# Altium footprint library UP-ROBOT Connectors(2013-02-26).PcbLib: 121 footprints (part 1 of 8)
Each footprint in its own frame and in the unit in brackets; x right, y up, seen from the top. Pads: shape width x height; smd on the part's side, far side on the other; paste and mask are expansions set on the pad; w line width, h text height; cw(c..) or ccw(c..) is an arc to the next point about the centre after c.
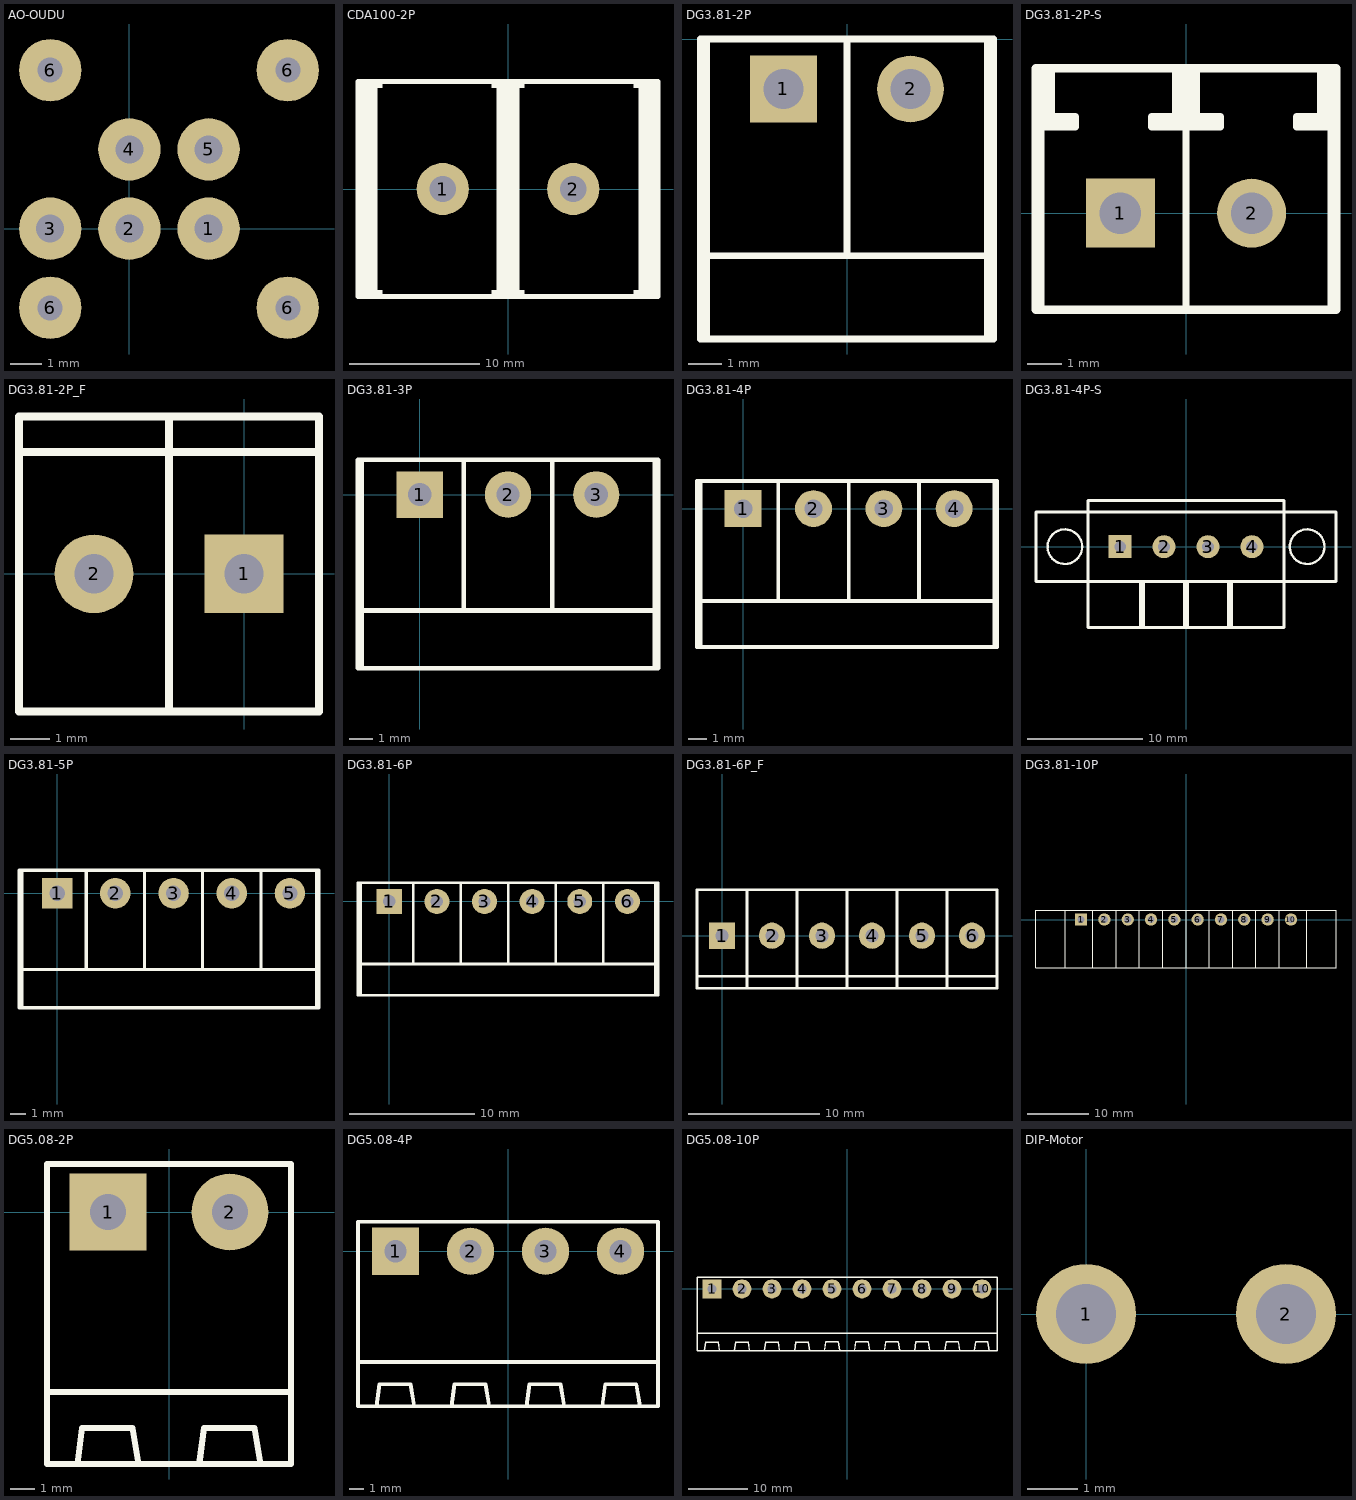
[diagram p0: the footprints below, top view; thin cyan lines are the x and y axes]

## AO-OUDU [mm]
pads (9):
  round 2 hole 0.9: 1(2.54,0) 2(0,0) 3(-2.54,0) 4(0,2.54) 5(2.54,2.54)
  round 2 hole 0.8: 6(-2.54,-2.54) 6(-2.54,5.08) 6(5.08,-2.54) 6(5.08,5.08)
3D body: height 12.96, standoff -2.94, extent -5.512,-4.63 71.198,7.17

## CDA100-2P [mm]
height 18
pads (2):
  round 4 hole 2: 1(-5,0) 2(5,0)
Top Overlay:
  rectangle: -1.25,7.75 1.25,8.25
  region: 1.25,-7.75 -1.25,-7.75 -1.25,-8.25 1.25,-8.25
  rectangle: -0.875,-7.875 0.875,7.9
  rectangle: 10,-7.875 11.45,7.825
  region: 11.5,-7.75 9.625,-7.75 9.625,-8.25 11.5,-8.25
  rectangle: 9.625,7.75 11.5,8.25
  rectangle: -11.45,-7.875 -10,7.95
  region: -9.625,-7.75 -11.5,-7.75 -11.5,-8.25 -9.625,-8.25
  rectangle: -11.5,7.75 -9.625,8.25
  lines w0.2: -11.2,-8.25 -11.2,8.25 ; 0,-8.25 0,8.25 ; 11.2,-8.25 11.2,8.25
  lines w0.4: -11.5,-8.25 11.5,-8.25 11.5,8.25 -11.5,8.25 -11.5,-8.25
3D body: height 17.25, standoff -5.45, extent -10.6,-7.8 11.8,7.6

## DG3.81-2P [mm]
pads (2):
  rect 2x2 hole 1.2: 1(-1.905,-1.5)
  round 2 hole 1.2: 2(1.905,-1.5)
Top Overlay:
  lines w0.203: -4.405,-6.5 4.394,-6.5 ; -4.205,-9 -4.205,0 ; 0,-6.5 0,0 ; 4.205,-9 4.205,0 ; 0,0 4.405,0 4.405,-9 -4.405,-9 -4.405,0 0,0
3D body: height 7, standoff -3.64, extent -4.415,-9.064 4.365,0.076

## DG3.81-2P-S [mm]
pads (2):
  rect 2x2 hole 1.2: 1(-1.905,0)
  round 2 hole 1.2: 2(1.905,0)
Top Overlay:
  lines w0.203: -4.35,-2.8 -4.2,-2.8 -4.2,4.2 ; -4.2,2.5 -3.2,2.5 -3.2,2.8 -3.9,2.8 -3.9,4.2 -4,4.2 -4,2.5 ; -4.2,2.65 -3.35,2.65 ; -0.85,2.65 0,2.65 0.85,2.65 ; -0.2,2.5 -0.2,4.2 -0.3,4.2 -0.3,2.8 -1,2.8 -1,2.5 0,2.5 1,2.5 1,2.8 0.3,2.8 0.3,4.2 0.2,4.2 0.2,2.5 ; 0,-2.8 0,4.2 ; 3.35,2.65 4.2,2.65 ; 4,2.5 4,4.2 3.9,4.2 3.9,2.8 3.2,2.8 3.2,2.5 4.2,2.5 ; 4.1,4.2 4.2,4.2 4.2,-2.8
  lines w0.254: -4.35,-2.8 -4.35,4.2 0,4.2 4.35,4.2 4.35,-2.8 -4.35,-2.8
3D body: height 9.24, standoff -2, extent -4.29,-2.925 4.4,4.375

## DG3.81-2P_F [mm]
pads (2):
  rect 2x2 hole 1: 1(0,0)
  round 2 hole 1: 2(-3.81,0)
Top Overlay:
  lines w0.203: -5.715,3.1 1.905,3.1 ; -5.715,3.937 -5.715,-3.5 1.905,-3.5 1.905,4 -5.715,4 ; -1.905,-3.5 -1.905,3.937
3D body: height 9, standoff -3, extent -5.71,-3.3 1.91,3.7

## DG3.81-3P [mm]
pads (3):
  rect 2x2 hole 1: 1(0,0)
  round 2 hole 1: 2(3.81,0) 3(7.62,0)
Top Overlay:
  lines w0.203: -2.5,-7.5 -2.5,1.5 ; -2.5,-5 10.16,-5 ; 1.905,-5 1.905,1.5 ; 5.715,-5 5.715,1.5 ; 10.16,-7.493 10.16,1.507 ; -2.667,-7.5 -2.667,1.5 1.8,1.5 10.287,1.5 10.287,-7.5 -2.667,-7.5
3D body: height 7, standoff -3.64, extent -2.775,-7.62 10.395,1.52

## DG3.81-4P [mm]
pads (4):
  rect 2x2 hole 1: 1(0,0)
  round 2 hole 1: 2(3.81,0) 3(7.62,0) 4(11.43,0)
Top Overlay:
  lines w0.203: -2.5,-5 13.75,-5 ; -2.3,-7.5 -2.3,1.5 ; 1.905,-5 1.905,1.5 ; 5.715,-5 5.715,1.5 ; 9.525,-5 9.525,1.5 ; 13.6,-7.5 13.6,1.5 ; -2.5,-7.5 -2.5,1.5 1.8,1.5 13.75,1.5 13.75,-7.5 -2.5,-7.5
3D body: height 7, standoff -1.9, extent -2.25,-7.5 13.45,1.5

## DG3.81-4P-S [mm]
pads (4):
  rect 2x2 hole 1: 1(-5.715,0)
  round 2 hole 1: 2(-1.905,0) 3(1.905,0) 4(5.715,0)
Top Overlay:
  circle w0.203: c-10.5,0 r1.5
  circle w0.203: c10.5,0 r1.5
  rectangle: 3.56,-7 4.06,-3
  rectangle: -4.06,-7 -3.56,-3
  rectangle: -0.25,-7 0.25,-3
  lines w0.254: -8.5,3 -8.5,-7 8.5,-7 8.5,3 ; -8.5,3 8.5,3 ; -8.5,3 -13,3 -13,-3 0,-3 13,-3 13,3 8.5,3 ; -8.5,3 -8.5,4 8.5,4 8.5,3

## DG3.81-5P [mm]
pads (5):
  rect 2x2 hole 1: 1(0,0)
  round 2 hole 1: 2(3.81,0) 3(7.62,0) 4(11.43,0) 5(15.24,0)
Top Overlay:
  lines w0.203: -2.5,-5 17.145,-5 ; -2.3,-7.5 -2.3,1.5 ; 1.905,-5 1.905,1.5 ; 5.715,-5 5.715,1.5 ; 9.525,-5 9.525,1.5 ; 13.335,-5 13.335,1.5 ; 17,-7.5 17,1.5 ; -2.5,-7.5 -2.5,1.5 1.8,1.5 17.145,1.5 17.145,-7.5 -2.5,-7.5
3D body: height 7, standoff -1.9, extent -2.255,-7.5 17.255,1.5

## DG3.81-6P [mm]
pads (6):
  rect 2x2 hole 1: 1(0,0)
  round 2 hole 1: 2(3.81,0) 3(7.62,0) 4(11.43,0) 5(15.24,0) 6(19.05,0)
Top Overlay:
  lines w0.203: -2.5,-5 21.4,-5 ; -2.3,-7.5 -2.3,1.5 ; 1.905,-5 1.905,1.5 ; 5.715,-5 5.715,1.5 ; 9.525,-5 9.525,1.5 ; 13.335,-5 13.335,1.5 ; 17.135,-5 17.135,1.4 ; 21.3,-7.5 21.3,1.5 ; -2.5,-7.5 21.5,-7.5 21.5,1.5 1.8,1.5 -2.5,1.5 -2.5,-7.5
3D body: height 7.4, standoff -2.9, extent -2.9,-7.74 21.81,1.5

## DG3.81-6P_F [mm]
pads (6):
  rect 2x2 hole 1: 1(0,0)
  round 2 hole 1: 2(3.81,0) 3(7.62,0) 4(11.43,0) 5(15.24,0) 6(19.05,0)
Top Overlay:
  lines w0.203: -1.905,-3.1 17.145,-3.1 20.945,-3.1 ; 1.905,-3.937 1.905,3.5 ; 5.715,-3.937 5.715,3.5 ; 9.525,-3.937 9.525,3.5 ; 13.335,-3.937 13.335,3.5 ; 17.145,-4 20.955,-4 20.955,3.5 17.145,3.5 ; 17.145,-4 17.145,3.5 ; 17.145,-4 -1.905,-4 -1.905,3.5 17.145,3.5
3D body: height 9, standoff -3, extent 13.335,-3.718 20.955,3.282
3D body: height 9, standoff -3, extent 5.715,-3.718 13.335,3.281
3D body: height 9, standoff -3, extent 9.525,-3.718 17.145,3.281
3D body: height 9, standoff -3, extent -1.905,-3.718 5.715,3.281

## DG3.81-10P [mm]
pads (10):
  rect 2x2 hole 1.2: 1(-17.145,0)
  round 2 hole 1.2: 2(-13.335,0) 3(-9.525,0) 4(-5.715,0) 5(-1.905,0) 6(1.905,0) 7(5.715,0) 8(9.525,0) 9(13.335,0) 10(17.145,0)
Top Overlay:
  lines w0.127: -11.43,-7.85 -11.43,1.5 ; -7.62,-7.85 -7.62,1.5 ; -3.81,-7.85 -3.81,1.5 ; 0,-7.84 0,1.5 ; 3.81,-7.85 3.81,1.5 ; 7.62,-7.85 7.62,1.5 ; 11.43,-7.85 11.43,1.5 ; -19.7,-7.85 -15.24,-7.85 ; -19.7,-7.85 -24.5,-7.85 -24.5,1.5 -19.7,1.5 ; -19.7,-7.85 -19.7,1.5 ; -19.7,1.5 -15.24,1.5 ; -15.24,-7.85 15.24,-7.85 ; -15.24,-7.85 -15.24,1.5 ; -15.24,1.5 0,1.5 ; 0,1.5 15.24,1.5 ; 15.24,-7.85 19.7,-7.85 ; 15.24,-7.85 15.24,1.5 ; 15.24,1.5 19.7,1.5 ; 19.7,-7.85 24.5,-7.85 24.5,1.5 19.7,1.5 ; 19.7,-7.85 19.7,1.5
3D body: height 7.33, standoff -2.97, extent -24.5,-7.79 24.5,1.45

## DG5.08-2P [mm]
pads (2):
  rect 3.2x3.2 hole 1.5: 1(-2.54,0)
  round 3.2 hole 1.5: 2(2.54,0)
Top Overlay:
  lines w0.254: -5.08,-7.5 5.08,-7.5 ; -3.82,-10.5 -3.62,-9 -1.52,-9 -1.27,-10.5 -3.81,-10.5 ; 1.26,-10.5 1.46,-9 3.56,-9 3.81,-10.5 ; -5.08,-10.5 5.08,-10.5 5.08,2 0,2 -5.08,2 -5.08,-10.5
3D body: height 7.9, standoff -3.8, extent -5,-10.576 5,1.524

## DG5.08-4P [mm]
pads (4):
  rect 3.2x3.2 hole 1.5: 1(-7.62,0)
  round 3.2 hole 1.5: 2(-2.54,0) 3(2.54,0) 4(7.62,0)
Top Overlay:
  lines w0.254: -10.16,-7.5 10.16,-7.5 ; -8.9,-10.5 -8.7,-9 -6.6,-9 -6.35,-10.5 ; -8.89,-7.5 -6.35,-7.5 ; -3.82,-10.5 -3.62,-9 -1.52,-9 -1.27,-10.5 -3.81,-10.5 ; 1.26,-10.5 1.46,-9 3.56,-9 3.81,-10.5 ; 6.39,-10.5 6.59,-9 8.69,-9 8.94,-10.5 ; -10.16,-10.5 -10.16,2 0,2 10.16,2 10.16,-10.5 -10.16,-10.5
3D body: height 7.9, standoff -3.8, extent -10,-10.576 10,1.524

## DG5.08-10P [mm]
pads (10):
  rect 3.2x3.2 hole 1.5: 1(-22.86,0)
  round 3.2 hole 1.5: 2(-17.78,0) 3(-12.7,0) 4(-7.62,0) 5(-2.54,0) 6(2.54,0) 7(7.62,0) 8(12.7,0) 9(17.78,0) 10(22.86,0)
Top Overlay:
  lines w0.254: -25.4,-7.5 25.39,-7.5 ; -24.14,-10.5 -23.94,-9 -21.84,-9 -21.59,-10.5 ; -24.13,-7.5 -21.59,-7.5 ; -19.06,-10.5 -18.86,-9 -16.76,-9 -16.51,-10.5 -19.05,-10.5 ; -13.98,-10.5 -13.78,-9 -11.68,-9 -11.43,-10.5 ; -8.85,-10.5 -8.65,-9 -6.55,-9 -6.3,-10.5 ; -3.81,-10.43 -3.61,-8.93 -1.51,-8.93 -1.26,-10.43 ; 1.27,-10.46 1.47,-8.96 3.57,-8.96 3.82,-10.46 ; 6.35,-10.44 6.55,-8.94 8.65,-8.94 8.9,-10.44 ; 11.44,-10.46 11.64,-8.96 13.74,-8.96 13.99,-10.46 ; 16.58,-10.48 16.78,-8.98 18.88,-8.98 19.13,-10.48 ; 21.57,-10.48 21.77,-8.98 23.87,-8.98 24.12,-10.48 ; -25.4,-10.5 -25.4,2 -15.24,2 25.4,2 25.4,-10.5 -25.4,-10.5

## DIP-Motor [mm]
pads (2):
  round 2 hole 1.2: 1(0,0) 2(4,0)